# Altium footprint library mfmc_footprints.PcbLib: 156 footprints (part 10 of 10)
Each footprint in its own frame and in the unit in brackets; x right, y up, seen from the top. Pads: shape width x height; smd on the part's side, far side on the other; paste and mask are expansions set on the pad; w line width, h text height; cw(c..) or ccw(c..) is an arc to the next point about the centre after c.
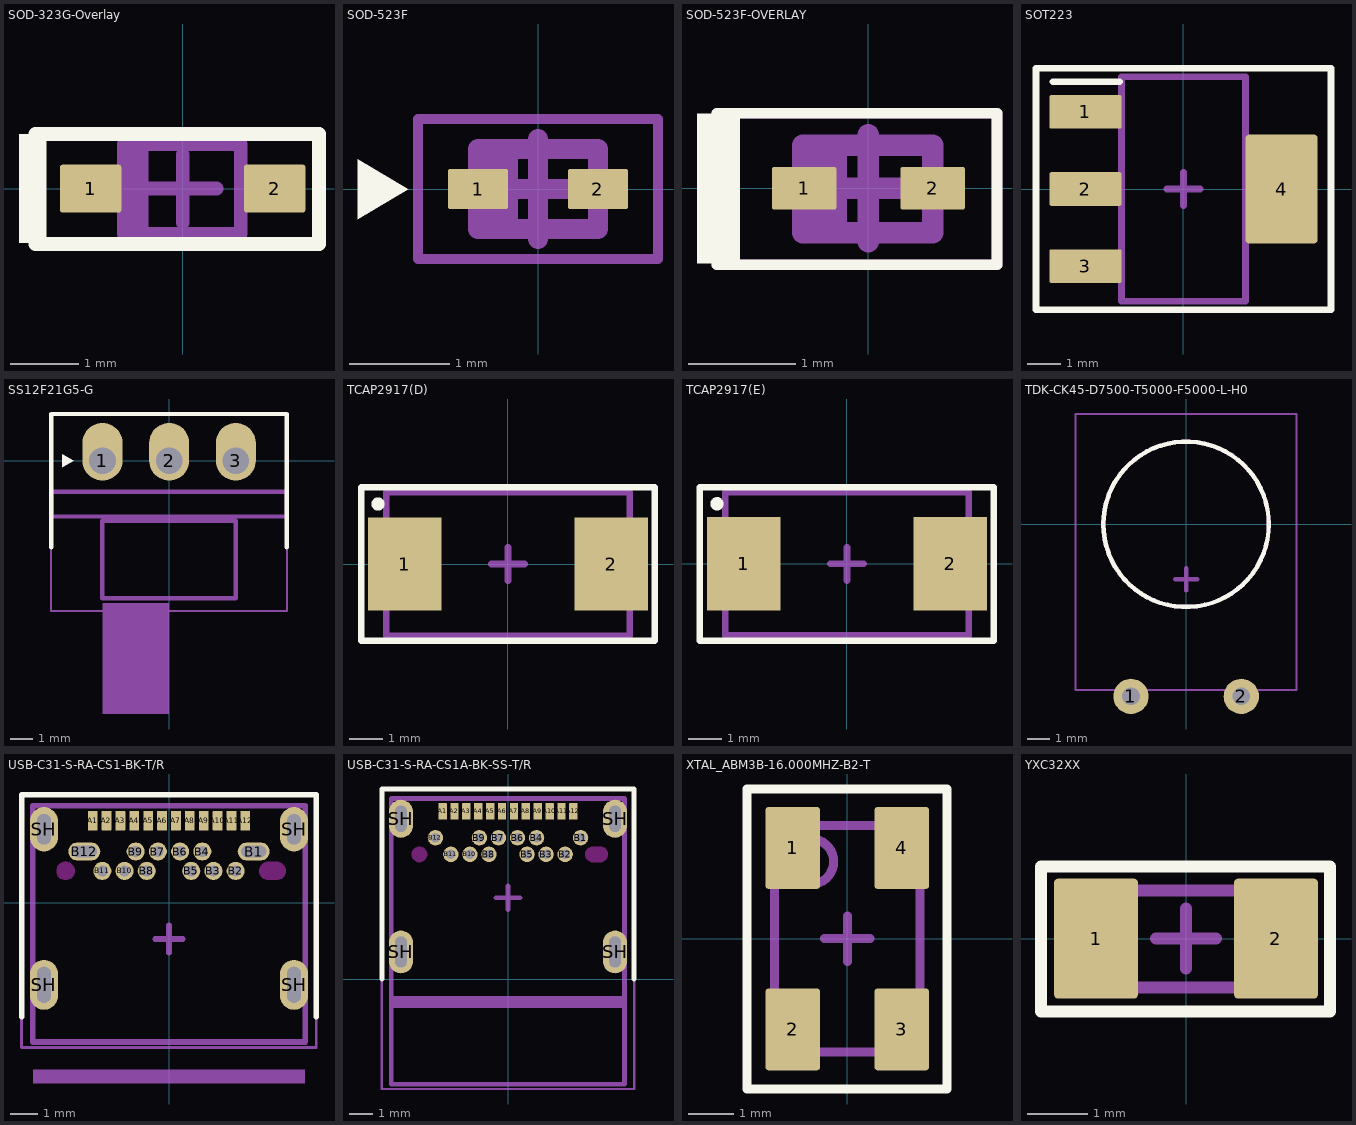
[diagram p9: the footprints below, top view; thin cyan lines are the x and y axes]

## SOD-323G-Overlay [mm] "Small Outline Diode with Overlay"
height 1
pads (2):
  rrect10% 0.9x0.7 smd: 1(-1.35,0) 2(1.35,0)
Top Overlay:
  rectangle: -2.4,-0.8 -2,0.8
  lines w0.2: -2.163,-0.813 2,-0.813 2,0.8 -2.163,0.8 -2.163,-0.813
Top Courtyard:
  lines w0.1: -2.163,-0.813 2,-0.813 2,0.8 -2.163,0.8 -2.163,-0.813
  lines w0.2: -0.5,0 0.5,0 ; 0,-0.5 0,0.5
Top Assembly:
  rectangle: -0.9,-0.65 -0.5,0.65
  lines w0.2: -0.863,-0.663 0.85,-0.663 0.85,0.65 -0.863,0.65 -0.863,-0.663
Top Designator (Mech10):
  text ".Designator" at -7.768,-0.514 h1.52
3D body "User Library-SOD323-1.step": height 1.1, standoff 0, extent -1.3,-0.675 1.3,0.675

## SOD-523F [mm] "Small Outline Diode FLAT NARROW LEADS"
height 0.6
pads (2):
  rrect10% 0.6x0.4 smd: 1(-0.6,0) 2(0.6,0)
Top Overlay:
  region: -1.3,0 -1.8,-0.3 -1.8,0.3
Top Courtyard:
  lines w0.1: -1.2,-0.7 -1.2,0.7 1.2,0.7 1.2,-0.7 -1.2,-0.7
  lines w0.2: -0.5,0 0.5,0 ; 0,-0.5 0,0.5
Top Assembly:
  rectangle: -0.6,-0.4 -0.2,0.4
  lines w0.2: -0.6,-0.4 -0.6,0.4 0.6,0.4 0.6,-0.4 -0.6,-0.4
Top Designator (Mech10):
  text ".Designator" at -7.618,-0.383 h1.52
3D body "User Library-SOD523F.step": height 0.7, standoff 0, extent -0.85,-0.45 0.85,0.45

## SOD-523F-OVERLAY [mm] "Small Outline Diode FLAT NARROW LEADS"
height 0.6
pads (2):
  rrect10% 0.6x0.4 smd: 1(-0.6,0) 2(0.6,0)
Top Overlay:
  rectangle: -1.6,-0.7 -1.2,0.7
  lines w0.1: -1.413,-0.713 1.2,-0.713 1.2,0.7 -1.413,0.7 -1.413,-0.713
Top Courtyard:
  lines w0.1: -1.413,-0.713 1.2,-0.713 1.2,0.7 -1.413,0.7 -1.413,-0.713
  lines w0.2: -0.5,0 0.5,0 ; 0,-0.5 0,0.5
Top Assembly:
  rectangle: -0.6,-0.4 -0.2,0.4
  lines w0.2: -0.613,-0.413 0.6,-0.413 0.6,0.4 -0.613,0.4 -0.613,-0.413
Top Designator (Mech10):
  text ".Designator" at -7.793,-0.514 h1.52
3D body "User Library-SOD523F.step": height 0.7, standoff 0, extent -0.85,-0.45 0.85,0.45

## SOT223 [mm] "SOT223, 4-Leads, Body 6,50x7,00mm (avg), Pitch 2,30mm, IPC Medium Density"
height 1.8
pads (4):
  rrect10% 2.15x1 smd: 1(-2.925,2.3) 2(-2.925,0) 3(-2.925,-2.3)
  rrect10% 2.15x3.25 smd: 4(2.925,0)
Top Overlay:
  lines w0.2: -3.9,3.2 -1.9,3.2 ; -4.4,-3.6 4.4,-3.6 4.4,3.6 -4.4,3.6 -4.4,-3.6
Top Courtyard:
  lines w0.1: -4.4,-3.6 4.4,-3.6 4.4,3.6 -4.4,3.6 -4.4,-3.6
  lines w0.2: -0.5,0 0.5,0 ; 0,-0.5 0,0.5
Top Assembly:
  lines w0.2: -1.85,-3.35 -1.85,3.35 1.85,3.35 1.85,-3.35 -1.85,-3.35
Top Designator (Mech10):
  text ".Designator" at -7.618,-0.508 h1.52
3D body "SOT230P700X180-4N.step": height 1.8, standoff 0, extent -3.5,-3.35 3.5,3.35

## SS12F21G5-G [mm]
height 5.8
pads (3):
  oval 1.8x2.6 hole 1.2 copper offset 0,0.4: 1(-3,0) 2(0,0) 3(3,0)
Top Overlay:
  region: -4.8,0.3 -4.3,0 -4.8,-0.3
  lines w0.2: -5.3,-3.9 -5.3,2.1 5.3,2.1 5.3,-3.9
Top Courtyard:
  lines w0.1: -5.313,-6.763 5.3,-6.763 5.3,2.1 -5.313,2.1 -5.313,-6.763
  lines w0.2: -0.5,0 0.5,0 ; 0,-0.5 0,0.5
Top Assembly:
  rectangle: -3,-11.4 0,-6.4
  lines w0.2: -5.313,-2.513 5.3,-2.513 5.3,-1.4 -5.313,-1.4 -5.313,-2.513 ; -3.013,-6.2 3,-6.2 3,-2.713 -3.013,-2.713 -3.013,-6.2
Top Designator (Mech10):
  text ".Designator" at -7.624,-5.208 h1.52
3D body "SS12F21G5-G.STEP": height 5.81, standoff -2.99, extent -5.25,-11.6 5.25,0.2

## TCAP2917(D) [mm] "Molded Capacitor, 2-Leads, Body 7,30x4,30mm, IPC Medium Density"
height 4.1
pads (2):
  rect 2.2x2.8 smd: 1(-3.1,0) 2(3.1,0)
Top Overlay:
  circle w0.2: c-3.9,1.8 r0.1
  lines w0.2: -4.4,-2.3 4.4,-2.3 4.4,2.3 -4.4,2.3 -4.4,-2.3
Top Courtyard:
  lines w0.1: -4.4,-2.3 4.4,-2.3 4.4,2.3 -4.4,2.3 -4.4,-2.3
  lines w0.2: -0.5,0 0.5,0 ; 0,-0.5 0,0.5
Top Assembly:
  circle w0.2: c-3.2,0 r0.1
  lines w0.2: -3.65,-2.15 3.65,-2.15 3.65,2.15 -3.65,2.15 -3.65,-2.15
Top Designator (Mech10):
  text ".Designator" at -7.618,-0.508 h1.52
3D body "User Library-AVX_D_CASE.step": height 3.01, standoff 0, extent -3.7,-2.225 3.7,2.225

## TCAP2917(E) [mm] "Molded Capacitor, 2-Leads, Body 7,30x4,30mm, IPC Medium Density"
height 4.1
pads (2):
  rect 2.2x2.8 smd: 1(-3.1,0) 2(3.1,0)
Top Overlay:
  circle w0.2: c-3.9,1.8 r0.1
  lines w0.2: -4.413,-2.313 4.4,-2.313 4.4,2.3 -4.413,2.3 -4.413,-2.313
Top Courtyard:
  lines w0.1: -4.4,-2.3 4.4,-2.3 4.4,2.3 -4.4,2.3 -4.4,-2.3
  lines w0.2: -0.5,0 0.5,0 ; 0,-0.5 0,0.5
Top Assembly:
  circle w0.2: c-3.2,0 r0.1
  lines w0.2: -3.65,-2.15 3.65,-2.15 3.65,2.15 -3.65,2.15 -3.65,-2.15
Top Designator (Mech10):
  text ".Designator" at -7.624,-0.514 h1.52
3D body "User Library-AVX_E_CASE.step": height 4.2, standoff 0, extent -3.7,-2.225 3.7,2.225

## TDK-CK45-D7500-T5000-F5000-L-H0 [mm]
height 5
pads (2):
  round 1.6 hole 0.8: 1(-2.5,-7.8) 2(2.5,-7.8)
Top Overlay:
  circle w0.2: c0,0 r3.75
Top Courtyard:
  lines w0.1: -5.013,-7.513 5,-7.513 5,5 -5.013,5 -5.013,-7.513
  lines w0.2: -0.5,-2.5 0.5,-2.5 ; 0,-3 0,-2
Top Assembly:
  circle w0.2: c0,0 r3.75
Top Designator (Mech10):
  text ".Designator" at -7.624,-2.334 h1.52
3D body "TDK-CK45-D7500-T5000-L-H0.STEP": height 5, standoff -2.5, extent -3.75,-8.05 3.75,3.75

## USB-C31-S-RA-CS1-BK-T/R [mm] "Universal serial bus, Type-C, Female, Right angle, Black insulator, Tape & Reel"
height 3.42
pads (28):
  rrect10% 0.35x0.7 smd: A1(-2.75,2.955) A2(-2.25,2.955) A3(-1.75,2.955) A4(-1.25,2.955) A5(-0.75,2.955) A6(-0.25,2.955) A7(0.25,2.955) A8(0.75,2.955) A9(1.25,2.955) A10(1.75,2.955) A11(2.25,2.955) A12(2.75,2.955)
  oval 1.15x0.65 hole 0.4 slot 0.9 at 0 deg: B1(3.05,1.845) B12(-3.05,1.845)
  round 0.65 hole 0.4: B2(2.4,1.145) B3(1.6,1.145) B4(1.2,1.845) B5(0.8,1.145) B6(0.4,1.845) B7(-0.4,1.845) B8(-0.8,1.145) B9(-1.2,1.845) B10(-1.6,1.145) B11(-2.4,1.145)
  rrect100% 1x1.8 hole 0.5 slot 1.3 at 90 deg: SH(-4.5,-2.955) SH(4.5,-2.955)
  rrect100% 1x1.6 hole 0.5 slot 1.1 at 90 deg: SH(-4.5,2.645) SH(4.5,2.645)
Top Overlay:
  lines w0.2: -5.3,-4.105 -5.3,3.895 5.3,3.895 5.3,-4.105
Keep-Out Layer:
  board cut-out: -3.725,0.82 -3.79,0.82 -3.909,0.869 -4.001,0.961 -4.05,1.08 -4.05,1.145 -4.05,1.21 -4.001,1.329 -3.909,1.421 -3.79,1.47 -3.725,1.47 -3.66,1.47 -3.541,1.421 -3.449,1.329 -3.4,1.21 -3.4,1.145 -3.4,1.08 -3.449,0.961 -3.541,0.869 -3.66,0.82
  board cut-out: 3.575,0.82 3.51,0.82 3.391,0.869 3.299,0.961 3.25,1.08 3.25,1.21 3.299,1.329 3.391,1.421 3.51,1.47 3.575,1.47 3.875,1.47 3.94,1.47 4.059,1.421 4.151,1.329 4.2,1.21 4.2,1.08 4.151,0.961 4.059,0.869 3.94,0.82 3.875,0.82
Top Courtyard:
  lines w0.1: -5.313,-5.213 5.3,-5.213 5.3,3.895 -5.313,3.895 -5.313,-5.213
  lines w0.2: -0.5,-1.305 0.5,-1.305 ; 0,-1.805 0,-0.805
Top Assembly:
  rectangle: -4.9,-6.505 4.9,-6.005
  lines w0.2: -4.913,-5.013 4.9,-5.013 4.9,3.495 -4.913,3.495 -4.913,-5.013
Top Designator (Mech10):
  text ".Designator" at -7.618,-1.763 h1.52

## USB-C31-S-RA-CS1A-BK-SS-T/R [mm]
height 3.42
pads (28):
  rrect10% 0.35x0.7 smd: A1(-2.75,7.06) A2(-2.25,7.06) A3(-1.75,7.06) A4(-1.25,7.06) A5(-0.75,7.06) A6(-0.25,7.06) A7(0.25,7.06) A8(0.75,7.06) A9(1.25,7.06) A10(1.75,7.06) A11(2.25,7.06) A12(2.75,7.06)
  round 0.65 hole 0.4: B1(3.05,5.95) B2(2.4,5.25) B3(1.6,5.25) B4(1.2,5.95) B5(0.8,5.25) B6(0.4,5.95) B7(-0.4,5.95) B8(-0.8,5.25) B9(-1.2,5.95) B10(-1.6,5.25) B11(-2.4,5.25) B12(-3.05,5.95)
  rrect100% 1x1.8 hole 0.5 slot 1.3 at 90 deg: SH(-4.5,1.15) SH(4.5,1.15)
  rrect100% 1x1.6 hole 0.5 slot 1.1 at 90 deg: SH(-4.5,6.75) SH(4.5,6.75)
Top Overlay:
  lines w0.2: -5.3,0 -5.3,8 5.3,8 5.3,0
Keep-Out Layer:
  board cut-out: 3.575,4.925 3.51,4.925 3.391,4.974 3.299,5.066 3.25,5.185 3.25,5.315 3.299,5.434 3.391,5.526 3.51,5.575 3.575,5.575 3.875,5.575 3.94,5.575 4.059,5.526 4.151,5.434 4.2,5.315 4.2,5.185 4.151,5.066 4.059,4.974 3.94,4.925 3.875,4.925
  board cut-out: -3.725,4.925 -3.79,4.925 -3.909,4.974 -4.001,5.066 -4.05,5.185 -4.05,5.25 -4.05,5.315 -4.001,5.434 -3.909,5.526 -3.79,5.575 -3.725,5.575 -3.66,5.575 -3.541,5.526 -3.449,5.434 -3.4,5.315 -3.4,5.25 -3.4,5.185 -3.449,5.066 -3.541,4.974 -3.66,4.925
Top Courtyard:
  lines w0.1: -5.313,-4.613 5.3,-4.613 5.3,8 -5.313,8 -5.313,-4.613
  lines w0.2: -0.5,3.424 0.5,3.424 ; 0,2.924 0,3.924
Top Assembly:
  rectangle: -4.9,-1.2 4.9,-0.7
  lines w0.2: -4.913,-4.413 4.9,-4.413 4.9,7.6 -4.913,7.6 -4.913,-4.413
Top Designator (Mech10):
  text ".Designator" at -7.618,1.211 h1.52

## XTAL_ABM3B-16.000MHZ-B2-T [mm]
height 1.1
pads (4):
  rrect10% 1.2x1.8 smd: 1(-1.2,2) 2(-1.2,-2) 3(1.2,-2) 4(1.2,2)
Top Overlay:
  lines w0.2: -2.213,-3.313 2.2,-3.313 2.2,3.3 -2.213,3.3 -2.213,-3.313
Top Courtyard:
  lines w0.1: -2.2,-3.3 2.2,-3.3 2.2,3.3 -2.2,3.3 -2.2,-3.3
  lines w0.2: -0.5,0 0.5,0 ; 0,-0.5 0,0.5
Top Assembly:
  circle w0.2: c-0.8,1.7 r0.5
  lines w0.2: -1.6,-2.5 -1.6,2.5 1.6,2.5 1.6,-2.5 -1.6,-2.5
Top Designator (Mech10):
  text ".Designator" at -7.624,-0.514 h1.52
3D body "step_temp.STEP": height 1.1, standoff 0, extent -1.6,-2.5 1.6,2.5

## YXC32XX [mm]
height 0.6
pads (2):
  rrect10% 1.4x2 smd: 1(-1.5,0) 2(1.5,0)
Top Overlay:
  lines w0.2: -2.413,-1.213 2.4,-1.213 2.4,1.2 -2.413,1.2 -2.413,-1.213
Top Courtyard:
  lines w0.1: -2.4,-1.2 -2.4,1.2 2.4,1.2 2.4,-1.2 -2.4,-1.2
  lines w0.2: -0.5,0 0.5,0 ; 0,-0.5 0,0.5
Top Assembly:
  lines w0.2: -1.613,-0.813 1.6,-0.813 1.6,0.8 -1.613,0.8 -1.613,-0.813
Top Designator (Mech10):
  text ".Designator" at -7.624,-0.514 h1.52
3D body "YXC32XX.STEP": height 0.75, standoff 0, extent -1.6,-0.75 1.6,0.75